# Altium footprint library 6-Connectors-3.PcbLib: 153 footprints (part 3 of 11) (continued)
## PHOENIX_1714968 [mm] "Terminal Block, 30A 300V, Pitch 6.35mm, 3 Positions, Screw Connection"
height 21.5
pads (3):
  round 2 hole 1.3: 1(-6.35,0) 2(0,0) 3(6.35,0)
Top Overlay:
  lines w0.2: -9.525,-7.5 9.525,-7.5 ; -9.525,-5.207 -9.654,-5.207 -9.832,-5.357 -10.095,-5.357 -10.095,-4.643 -9.832,-4.643 -9.654,-4.793 -9.525,-4.793 ; -9.525,-4.729 9.525,-4.729 ; -9.525,-2.7 -9.233,-2.7 ; -9.525,-2.2 -8.912,-2.2 ; -9.525,-0.2 -8.912,-0.2 ; -9.525,0.3 -9.233,0.3 ; -9.525,2.05 9.525,2.05 ; -9.525,2.354 9.525,2.354 ; -9.525,3.393 -9.654,3.393 -9.832,3.243 -10.095,3.243 -10.095,3.957 -9.832,3.957 -9.654,3.807 -9.525,3.807 ; -9.525,4.1 9.525,4.1 ; -8.348,-2.703 -6.998,-1.353 ; -7.853,-3.198 -6.14,-1.485 ; -7.405,1.067 ccw(c-6.35,-1.2) -5.295,1.067 ; -4.997,0.648 -4.847,0.798 ; -4.865,-0.21 -4.352,0.303 ; -1.998,-2.703 -0.648,-1.353 ; -1.503,-3.198 0.21,-1.485 ; -1.055,1.067 ccw(c0,-1.2) 1.055,1.067 ; 1.353,0.648 1.503,0.798 ; 1.485,-0.21 1.998,0.303 ; 4.352,-2.703 5.702,-1.353 ; 4.847,-3.198 6.56,-1.485 ; 5.295,1.067 ccw(c6.35,-1.2) 7.405,1.067 ; 7.703,0.648 7.853,0.798 ; 7.835,-0.21 8.348,0.303 ; 9.525,-2.7 9.233,-2.7 ; 9.525,-2.2 8.912,-2.2 ; 9.525,-0.2 8.912,-0.2 ; 9.525,0.3 9.233,0.3 ; -9.233,-2.7 ccw(c-6.35,-1.2) -3.467,-2.7 ; -9.233,-2.7 -8.912,-2.2 ; -9.233,0.3 cw(c-6.35,-1.2) -3.467,0.3 ; -9.233,0.3 -8.912,-0.2 ; -8.912,-2.2 ccw(c-6.35,-1.2) -3.788,-2.2 ; -8.912,-0.2 cw(c-6.35,-1.2) -3.788,-0.2 ; -3.788,-2.2 -2.562,-2.2 ; -3.788,-2.2 -3.467,-2.7 ; -3.788,-0.2 -3.467,0.3 ; -3.788,-0.2 -2.562,-0.2 ; -3.467,-2.7 -2.883,-2.7 ; -3.467,0.3 -2.883,0.3 ; -2.883,-2.7 ccw(c0,-1.2) 2.883,-2.7 ; -2.883,-2.7 -2.562,-2.2 ; -2.883,0.3 cw(c0,-1.2) 2.883,0.3 ; -2.883,0.3 -2.562,-0.2 ; -2.562,-2.2 ccw(c0,-1.2) 2.562,-2.2 ; -2.562,-0.2 cw(c0,-1.2) 2.562,-0.2 ; 2.562,-2.2 3.788,-2.2 ; 2.562,-2.2 2.883,-2.7 ; 2.562,-0.2 2.883,0.3 ; 2.562,-0.2 3.788,-0.2 ; 2.883,-2.7 3.467,-2.7 ; 2.883,0.3 3.467,0.3 ; 3.467,-2.7 ccw(c6.35,-1.2) 9.233,-2.7 ; 3.467,-2.7 3.788,-2.2 ; 3.467,0.3 cw(c6.35,-1.2) 9.233,0.3 ; 3.467,0.3 3.788,-0.2 ; 3.788,-2.2 ccw(c6.35,-1.2) 8.912,-2.2 ; 3.788,-0.2 cw(c6.35,-1.2) 8.912,-0.2 ; 8.912,-2.2 9.233,-2.7 ; 8.912,-0.2 9.233,0.3 ; -9.525,-7.9 -9.525,4.6 9.525,4.6 9.525,-7.9 -9.525,-7.9
  text "3" at 6.35,2.8 h1
  text "2" at -0.279,2.8 h1
  text "1" at -6.35,2.8 h1
Mechanical 8:
  lines w0.1: -6.85,0 -6.35,0 ; -6.35,-0.5 -6.35,0 ; -6.35,0.5 -6.35,0 ; -5.85,0 -6.35,0 ; -0.5,0 0,0 ; 0,-0.5 0,0 ; 0,0.5 0,0 ; 0.5,0 0,0 ; 5.85,0 6.35,0 ; 6.35,-0.5 6.35,0 ; 6.35,0.5 6.35,0 ; 6.85,0 6.35,0
Mechanical 14:
  circle w0.1: c-6.35,-1.2 r2.5
  circle w0.1: c0,-1.2 r2.5
  circle w0.1: c6.35,-1.2 r2.5
  lines w0.1: -9.525,-7.5 9.525,-7.5 ; -9.525,-5.207 -9.654,-5.207 -9.832,-5.357 -10.095,-5.357 -10.095,-4.643 -9.832,-4.643 -9.654,-4.793 -9.525,-4.793 ; -9.525,-4.729 9.525,-4.729 ; -9.525,-2.7 -9.233,-2.7 ; -9.525,-2.2 -8.912,-2.2 ; -9.525,-0.2 -8.912,-0.2 ; -9.525,0.3 -9.233,0.3 ; -9.525,2.05 9.525,2.05 ; -9.525,2.354 9.525,2.354 ; -9.525,3.393 -9.654,3.393 -9.832,3.243 -10.095,3.243 -10.095,3.957 -9.832,3.957 -9.654,3.807 -9.525,3.807 ; -9.525,4.1 9.525,4.1 ; -8.348,-2.703 -4.847,0.798 ; -7.853,-3.198 -4.352,0.303 ; -1.998,-2.703 1.503,0.798 ; -1.503,-3.198 1.998,0.303 ; 4.352,-2.703 7.853,0.798 ; 4.847,-3.198 8.348,0.303 ; 9.525,-2.7 9.233,-2.7 ; 9.525,-2.2 8.912,-2.2 ; 9.525,-0.2 8.912,-0.2 ; 9.525,0.3 9.233,0.3 ; -9.233,-2.7 ccw(c-6.35,-1.2) -3.467,-2.7 ; -9.233,-2.7 -8.912,-2.2 ; -9.233,0.3 cw(c-6.35,-1.2) -3.467,0.3 ; -9.233,0.3 -8.912,-0.2 ; -8.912,-2.2 ccw(c-6.35,-1.2) -3.788,-2.2 ; -8.912,-0.2 cw(c-6.35,-1.2) -3.788,-0.2 ; -3.788,-2.2 -2.562,-2.2 ; -3.788,-2.2 -3.467,-2.7 ; -3.788,-0.2 -3.467,0.3 ; -3.788,-0.2 -2.562,-0.2 ; -3.467,-2.7 -2.883,-2.7 ; -3.467,0.3 -2.883,0.3 ; -2.883,-2.7 ccw(c0,-1.2) 2.883,-2.7 ; -2.883,-2.7 -2.562,-2.2 ; -2.883,0.3 cw(c0,-1.2) 2.883,0.3 ; -2.883,0.3 -2.562,-0.2 ; -2.562,-2.2 ccw(c0,-1.2) 2.562,-2.2 ; -2.562,-0.2 cw(c0,-1.2) 2.562,-0.2 ; 2.562,-2.2 3.788,-2.2 ; 2.562,-2.2 2.883,-2.7 ; 2.562,-0.2 2.883,0.3 ; 2.562,-0.2 3.788,-0.2 ; 2.883,-2.7 3.467,-2.7 ; 2.883,0.3 3.467,0.3 ; 3.467,-2.7 ccw(c6.35,-1.2) 9.233,-2.7 ; 3.467,-2.7 3.788,-2.2 ; 3.467,0.3 cw(c6.35,-1.2) 9.233,0.3 ; 3.467,0.3 3.788,-0.2 ; 3.788,-2.2 ccw(c6.35,-1.2) 8.912,-2.2 ; 3.788,-0.2 cw(c6.35,-1.2) 8.912,-0.2 ; 8.912,-2.2 9.233,-2.7 ; 8.912,-0.2 9.233,0.3 ; -9.525,-7.9 -9.525,4.6 9.525,4.6 9.525,-7.9 -9.525,-7.9
  text "1" at -6.35,2.8 h1
  text "2" at -0.279,2.8 h1
  text "3" at 6.35,2.8 h1
3D body "PHOENIX_1714968.stp": height 21.5, standoff -5, extent -10.095,-7.9 9.525,4.6

## PHOENIX_1715721 [mm] "Terminal Block, 17.5A 400V, Pitch 5.08mm, 2 Positions, Screw Connection"
height 13.8
pads (2):
  round 2 hole 1.3: 1(-2.54,0) 2(2.54,0)
Top Overlay:
  circle w0.2: c2.54,-0.2 r2
  circle w0.2: c-2.54,-0.2 r2
  circle w0.2: c0,1.1 r0.5
  lines w0.2: -5.08,-4.1 5.08,-4.1 ; -5.08,-3.869 -5.247,-3.869 -5.479,-4.064 -5.821,-4.064 -5.821,-3.136 -5.479,-3.136 -5.247,-3.331 -5.08,-3.331 ; -5.08,-2.672 5.08,-2.672 ; -5.08,-2.283 5.08,-2.283 ; -5.08,1.909 5.08,1.909 ; -5.08,2.29 5.08,2.29 ; -5.08,-4.6 -5.08,5.2 5.08,5.2 5.08,-4.6 -5.08,-4.6
  text "1" at -2.699,2.857 h1
  text "2" at 2.222,2.857 h1
Mechanical 8:
  lines w0.1: -3.04,0 -2.54,0 ; -2.54,-0.5 -2.54,0 ; -2.54,0.5 -2.54,0 ; -2.04,0 -2.54,0 ; -0.5,0 0,0 ; 0,-0.5 0,0 ; 0,0.5 0,0 ; 0.5,0 0,0 ; 2.04,0 2.54,0 ; 2.54,-0.5 2.54,0 ; 2.54,0.5 2.54,0 ; 3.04,0 2.54,0
Mechanical 14:
  circle w0.1: c-2.54,-0.2 r1.891
  circle w0.1: c2.54,-0.2 r1.891
  circle w0.1: c0,1.1 r0.5
  circle w0.1: c-2.54,-0.2 r2
  circle w0.1: c2.54,-0.2 r2
  lines w0.1: -5.08,-4.1 5.08,-4.1 ; -5.08,-3.869 -5.247,-3.869 -5.479,-4.064 -5.821,-4.064 -5.821,-3.136 -5.479,-3.136 -5.247,-3.331 -5.08,-3.331 ; -5.08,-2.672 5.08,-2.672 ; -5.08,-2.283 5.08,-2.283 ; -5.08,1.909 5.08,1.909 ; -5.08,2.29 5.08,2.29 ; -4.043,-1.349 -1.391,1.303 ; -3.689,-1.703 -1.037,0.949 ; 1.037,-1.349 3.689,1.303 ; 1.391,-1.703 4.043,0.949 ; -5.08,-4.6 5.08,-4.6 5.08,5.2 -5.08,5.2 -5.08,-4.6
  text "1" at -2.699,2.857 h1
  text "2" at 2.222,2.857 h1
3D body "PHOENIX_1715721.stp": height 14.19, standoff -3.5, extent -5.821,-4.6 5.08,5.2

## PHOENIX_1715734 [mm] "Terminal Block, 17.5A 400V, Pitch 5.08mm, 3 Positions, Screw Connection"
height 13.8
pads (3):
  round 2 hole 1.3: 1(-5.08,0) 2(0,0) 3(5.08,0)
Top Overlay:
  circle w0.2: c-2.54,1.1 r0.5
  circle w0.2: c2.54,1.1 r0.5
  circle w0.2: c-5.08,-0.2 r2
  circle w0.2: c0,-0.2 r2
  circle w0.2: c5.08,-0.2 r2
  lines w0.2: -7.62,-4.1 7.62,-4.1 ; -7.62,-3.869 -7.787,-3.869 -8.019,-4.064 -8.361,-4.064 -8.361,-3.136 -8.019,-3.136 -7.787,-3.331 -7.62,-3.331 ; -7.62,-2.672 7.62,-2.672 ; -7.62,-2.283 7.62,-2.283 ; -7.62,1.909 7.62,1.909 ; -7.62,2.29 7.62,2.29 ; -7.62,-4.6 7.62,-4.6 7.62,5.2 -7.62,5.2 -7.62,-4.6
  text "1" at -5.239,2.857 h1
  text "2" at -0.318,2.857 h1
  text "3" at 4.763,2.857 h1
Mechanical 8:
  lines w0.1: -5.58,0 -5.08,0 ; -5.08,-0.5 -5.08,0 ; -5.08,0.5 -5.08,0 ; -4.58,0 -5.08,0 ; -0.5,0 0,0 ; 0,-0.5 0,0 ; 0,0.5 0,0 ; 0.5,0 0,0 ; 4.58,0 5.08,0 ; 5.08,-0.5 5.08,0 ; 5.08,0.5 5.08,0 ; 5.58,0 5.08,0
Mechanical 14:
  circle w0.1: c5.08,-0.2 r2
  circle w0.1: c0,-0.2 r2
  circle w0.1: c-5.08,-0.2 r2
  circle w0.1: c2.54,1.1 r0.5
  circle w0.1: c-2.54,1.1 r0.5
  circle w0.1: c5.08,-0.2 r1.891
  circle w0.1: c0,-0.2 r1.891
  circle w0.1: c-5.08,-0.2 r1.891
  lines w0.1: -7.62,-4.1 7.62,-4.1 ; -7.62,-3.869 -7.787,-3.869 -8.019,-4.064 -8.361,-4.064 -8.361,-3.136 -8.019,-3.136 -7.787,-3.331 -7.62,-3.331 ; -7.62,-2.672 7.62,-2.672 ; -7.62,-2.283 7.62,-2.283 ; -7.62,1.909 7.62,1.909 ; -7.62,2.29 7.62,2.29 ; -6.583,-1.349 -3.931,1.303 ; -6.229,-1.703 -3.577,0.949 ; -1.503,-1.349 1.149,1.303 ; -1.149,-1.703 1.503,0.949 ; 3.577,-1.349 6.229,1.303 ; 3.931,-1.703 6.583,0.949 ; -7.62,-4.6 -7.62,5.2 7.62,5.2 7.62,-4.6 -7.62,-4.6
  text "1" at -5.239,2.857 h1
  text "2" at -0.318,2.857 h1
  text "3" at 4.763,2.857 h1
3D body "PHOENIX_1715734.stp": height 14.19, standoff -3.5, extent -8.361,-4.6 7.62,5.2

## PHOENIX_1715747 [mm] "Terminal Block, 17.5A 400V, Pitch 5.08mm, 4 Positions, Screw Connection"
height 13.8
pads (4):
  round 2 hole 1.3: 1(-7.62,0) 2(-2.54,0) 3(2.54,0) 4(7.62,0)
Top Overlay:
  circle w0.2: c-7.62,-0.2 r2
  circle w0.2: c-2.54,-0.2 r2
  circle w0.2: c2.54,-0.2 r2
  circle w0.2: c7.62,-0.2 r2
  circle w0.2: c-5.08,1.1 r0.49
  circle w0.2: c0,1.1 r0.49
  circle w0.2: c5.08,1.1 r0.49
  lines w0.2: -10.16,-4.1 10.16,-4.1 ; -10.16,-3.869 -10.327,-3.869 -10.559,-4.064 -10.901,-4.064 -10.901,-3.136 -10.559,-3.136 -10.327,-3.331 -10.16,-3.331 ; -10.16,-2.672 10.16,-2.672 ; -10.16,-2.283 10.16,-2.283 ; -10.16,1.909 10.16,1.909 ; -10.16,2.29 10.16,2.29 ; -10.16,-4.6 -10.16,5.2 10.16,5.2 10.16,-4.6 -10.16,-4.6
  text "4" at 7.302,2.857 h1
  text "3" at 2.222,2.857 h1
  text "2" at -2.857,2.857 h1
  text "1" at -7.779,2.857 h1
Mechanical 8:
  lines w0.1: -8.12,0 -7.62,0 ; -7.62,-0.5 -7.62,0 ; -7.62,0.5 -7.62,0 ; -7.12,0 -7.62,0 ; -3.04,0 -2.54,0 ; -2.54,-0.5 -2.54,0 ; -2.54,0.5 -2.54,0 ; -2.04,0 -2.54,0 ; 2.04,0 2.54,0 ; 2.54,-0.5 2.54,0 ; 2.54,0.5 2.54,0 ; 3.04,0 2.54,0 ; 7.12,0 7.62,0 ; 7.62,-0.5 7.62,0 ; 7.62,0.5 7.62,0 ; 8.12,0 7.62,0 ; 10.16,-3.869 9.993,-3.869 9.761,-4.064 9.419,-4.064 9.419,-3.136 9.761,-3.136 9.993,-3.331 10.16,-3.331
Mechanical 14:
  circle w0.1: c5.08,1.1 r0.49
  circle w0.1: c0,1.1 r0.49
  circle w0.1: c-5.08,1.1 r0.49
  circle w0.1: c7.62,-0.2 r2
  circle w0.1: c7.62,-0.2 r1.891
  circle w0.1: c2.54,-0.2 r2
  circle w0.1: c2.54,-0.2 r1.891
  circle w0.1: c-2.54,-0.2 r2
  circle w0.1: c-2.54,-0.2 r1.891
  circle w0.1: c-7.62,-0.2 r2
  circle w0.1: c-7.62,-0.2 r1.891
  lines w0.1: -10.16,-4.1 10.16,-4.1 ; -10.16,-3.869 -10.327,-3.869 -10.559,-4.064 -10.901,-4.064 -10.901,-3.136 -10.559,-3.136 -10.327,-3.331 -10.16,-3.331 ; -10.16,-2.672 10.16,-2.672 ; -10.16,-2.283 10.16,-2.283 ; -10.16,1.909 10.16,1.909 ; -10.16,2.29 10.16,2.29 ; -9.182,-1.267 -6.553,1.362 ; -8.687,-1.762 -6.058,0.867 ; -4.102,-1.267 -1.473,1.362 ; -3.607,-1.762 -0.978,0.867 ; 0.978,-1.267 3.607,1.362 ; 1.473,-1.762 4.102,0.867 ; 6.058,-1.267 8.687,1.362 ; 6.553,-1.762 9.182,0.867 ; -10.16,-4.6 10.16,-4.6 10.16,5.2 -10.16,5.2 -10.16,-4.6
  text "4" at 7.302,2.857 h1
  text "3" at 2.222,2.857 h1
  text "2" at -2.857,2.857 h1
  text "1" at -7.779,2.857 h1
3D body "PHOENIX_1715747.stp": height 14.2, standoff -3.5, extent -10.901,-4.6 10.16,5.2

## PHOENIX_1715789 [mm] "Terminal Block, 17.5A 400V, Pitch 5.08mm, 8 Positions, Screw Connection"
height 13.8
pads (8):
  round 2 hole 1.3: 1(-17.78,0) 2(-12.7,0) 3(-7.62,0) 4(-2.54,0) 5(2.54,0) 6(7.62,0) 7(12.7,0) 8(17.78,0)
Top Overlay:
  circle w0.2: c-17.78,-0.2 r2
  circle w0.2: c-12.7,-0.2 r2
  circle w0.2: c-7.62,-0.2 r2
  circle w0.2: c-2.54,-0.2 r2
  circle w0.2: c-15.24,1.1 r0.49
  circle w0.2: c-10.16,1.1 r0.49
  circle w0.2: c-5.08,1.1 r0.49
  circle w0.2: c2.54,-0.2 r2
  circle w0.2: c0,1.1 r0.49
  circle w0.2: c7.62,-0.2 r2
  circle w0.2: c5.08,1.1 r0.49
  circle w0.2: c12.7,-0.2 r2
  circle w0.2: c10.16,1.1 r0.49
  circle w0.2: c17.78,-0.2 r2
  circle w0.2: c15.24,1.1 r0.49
  lines w0.2: -20.32,-4.1 20.32,-4.1 ; -20.32,-3.869 -20.487,-3.869 -20.719,-4.064 -21.061,-4.064 -21.061,-3.136 -20.719,-3.136 -20.487,-3.331 -20.32,-3.331 ; -20.32,-2.672 20.32,-2.672 ; -20.32,-2.283 20.32,-2.283 ; -20.32,1.909 20.32,1.909 ; -20.32,2.29 20.32,2.29 ; -20.32,-4.6 -20.32,5.2 20.32,5.2 20.32,-4.6 -20.32,-4.6
  text "8" at 17.462,2.857 h1
  text "7" at 12.383,2.857 h1
  text "6" at 7.302,2.857 h1
  text "5" at 2.222,2.857 h1
  text "4" at -2.857,2.857 h1
  text "3" at -7.938,2.857 h1
  text "2" at -13.018,2.857 h1
  text "1" at -17.939,2.857 h1
Mechanical 8:
  lines w0.1: -18.28,0 -17.78,0 ; -17.78,-0.5 -17.78,0 ; -17.78,0.5 -17.78,0 ; -17.28,0 -17.78,0 ; -13.2,0 -12.7,0 ; -12.7,-0.5 -12.7,0 ; -12.7,0.5 -12.7,0 ; -12.2,0 -12.7,0 ; -8.12,0 -7.62,0 ; -7.62,-0.5 -7.62,0 ; -7.62,0.5 -7.62,0 ; -7.12,0 -7.62,0 ; -3.04,0 -2.54,0 ; -2.54,-0.5 -2.54,0 ; -2.54,0.5 -2.54,0 ; -2.04,0 -2.54,0 ; 2.04,0 2.54,0 ; 2.54,-0.5 2.54,0 ; 2.54,0.5 2.54,0 ; 3.04,0 2.54,0 ; 7.12,0 7.62,0 ; 7.62,-0.5 7.62,0 ; 7.62,0.5 7.62,0 ; 8.12,0 7.62,0 ; 12.2,0 12.7,0 ; 12.7,-0.5 12.7,0 ; 12.7,0.5 12.7,0 ; 13.2,0 12.7,0 ; 17.28,0 17.78,0 ; 17.78,-0.5 17.78,0 ; 17.78,0.5 17.78,0 ; 18.28,0 17.78,0 ; 20.32,-3.869 20.153,-3.869 19.921,-4.064 19.579,-4.064 19.579,-3.136 19.921,-3.136 20.153,-3.331 20.32,-3.331
Mechanical 14:
  circle w0.1: c15.24,1.1 r0.49
  circle w0.1: c17.78,-0.2 r2
  circle w0.1: c17.78,-0.2 r1.891
  circle w0.1: c10.16,1.1 r0.49
  circle w0.1: c12.7,-0.2 r2
  circle w0.1: c12.7,-0.2 r1.891
  circle w0.1: c5.08,1.1 r0.49
  circle w0.1: c7.62,-0.2 r2
  circle w0.1: c7.62,-0.2 r1.891
  circle w0.1: c0,1.1 r0.49
  circle w0.1: c2.54,-0.2 r2
  circle w0.1: c2.54,-0.2 r1.891
  circle w0.1: c-5.08,1.1 r0.49
  circle w0.1: c-10.16,1.1 r0.49
  circle w0.1: c-15.24,1.1 r0.49
  circle w0.1: c-2.54,-0.2 r2
  circle w0.1: c-2.54,-0.2 r1.891
  circle w0.1: c-7.62,-0.2 r2
  circle w0.1: c-7.62,-0.2 r1.891
  circle w0.1: c-12.7,-0.2 r2
  circle w0.1: c-12.7,-0.2 r1.891
  circle w0.1: c-17.78,-0.2 r2
  circle w0.1: c-17.78,-0.2 r1.891
  lines w0.1: -20.32,-4.1 20.32,-4.1 ; -20.32,-3.869 -20.487,-3.869 -20.719,-4.064 -21.061,-4.064 -21.061,-3.136 -20.719,-3.136 -20.487,-3.331 -20.32,-3.331 ; -20.32,-2.672 20.32,-2.672 ; -20.32,-2.283 20.32,-2.283 ; -20.32,1.909 20.32,1.909 ; -20.32,2.29 20.32,2.29 ; -19.342,-1.267 -16.713,1.362 ; -18.847,-1.762 -16.218,0.867 ; -14.262,-1.267 -11.633,1.362 ; -13.767,-1.762 -11.138,0.867 ; -9.182,-1.267 -6.553,1.362 ; -8.687,-1.762 -6.058,0.867 ; -4.102,-1.267 -1.473,1.362 ; -3.607,-1.762 -0.978,0.867 ; 0.978,-1.267 3.607,1.362 ; 1.473,-1.762 4.102,0.867 ; 6.058,-1.267 8.687,1.362 ; 6.553,-1.762 9.182,0.867 ; 11.138,-1.267 13.767,1.362 ; 11.633,-1.762 14.262,0.867 ; 16.218,-1.267 18.847,1.362 ; 16.713,-1.762 19.342,0.867 ; -20.32,-4.6 20.32,-4.6 20.32,5.2 -20.32,5.2 -20.32,-4.6
  text "8" at 17.462,2.857 h1
  text "7" at 12.383,2.857 h1
  text "6" at 7.302,2.857 h1
  text "5" at 2.222,2.857 h1
  text "4" at -2.857,2.857 h1
  text "3" at -7.938,2.857 h1
  text "2" at -13.018,2.857 h1
  text "1" at -17.939,2.857 h1
3D body "PHOENIX_1715789.stp": height 14.2, standoff -3.5, extent -21.061,-4.6 20.32,5.2

## PHOENIX_1715828 [mm] "Terminal Block, 17.5A 400V, Pitch 5.08mm, 12 Positions, Screw Connection"
height 13.8
pads (12):
  round 2 hole 1.3: 1(-27.94,0) 2(-22.86,0) 3(-17.78,0) 4(-12.7,0) 5(-7.62,0) 6(-2.54,0) 7(2.54,0) 8(7.62,0) 9(12.7,0) 10(17.78,0) 11(22.86,0) 12(27.94,0)
Top Overlay:
  circle w0.2: c25.4,1.1 r0.49
  circle w0.2: c27.94,-0.2 r2
  circle w0.2: c20.32,1.1 r0.49
  circle w0.2: c22.86,-0.2 r2
  circle w0.2: c15.24,1.1 r0.49
  circle w0.2: c17.78,-0.2 r2
  circle w0.2: c10.16,1.1 r0.49
  circle w0.2: c12.7,-0.2 r2
  circle w0.2: c5.08,1.1 r0.49
  circle w0.2: c7.62,-0.2 r2
  circle w0.2: c0,1.1 r0.49
  circle w0.2: c2.54,-0.2 r2
  circle w0.2: c-5.08,1.1 r0.49
  circle w0.2: c-2.54,-0.2 r2
  circle w0.2: c-10.16,1.1 r0.49
  circle w0.2: c-7.62,-0.2 r2
  circle w0.2: c-15.24,1.1 r0.49
  circle w0.2: c-20.32,1.1 r0.49
  circle w0.2: c-25.4,1.1 r0.49
  circle w0.2: c-12.7,-0.2 r2
  circle w0.2: c-17.78,-0.2 r2
  circle w0.2: c-22.86,-0.2 r2
  circle w0.2: c-27.94,-0.2 r2
  lines w0.2: -30.48,-4.1 30.48,-4.1 ; -30.48,-3.869 -30.647,-3.869 -30.879,-4.064 -31.221,-4.064 -31.221,-3.136 -30.879,-3.136 -30.647,-3.331 -30.48,-3.331 ; -30.48,-2.672 30.48,-2.672 ; -30.48,-2.283 30.48,-2.283 ; -30.48,1.909 30.48,1.909 ; -30.48,2.29 30.48,2.29 ; -30.48,-4.6 30.48,-4.6 30.48,5.2 -30.48,5.2 -30.48,-4.6
  text "8" at 7.303,2.857 h1
  text "7" at 2.223,2.857 h1
  text "6" at -2.857,2.857 h1
  text "5" at -7.937,2.857 h1
  text "4" at -13.017,2.857 h1
  text "3" at -18.097,2.857 h1
  text "2" at -23.177,2.857 h1
  text "1" at -28.099,2.857 h1
  text "9" at 12.383,2.857 h1
  text "10" at 17.145,2.857 h1
  text "11" at 22.225,2.857 h1
  text "12" at 27.146,2.857 h1
Mechanical 8:
  lines w0.1: -28.44,0 -27.94,0 ; -27.94,-0.5 -27.94,0 ; -27.94,0.5 -27.94,0 ; -27.44,0 -27.94,0 ; -23.36,0 -22.86,0 ; -22.86,-0.5 -22.86,0 ; -22.86,0.5 -22.86,0 ; -22.36,0 -22.86,0 ; -18.28,0 -17.78,0 ; -17.78,-0.5 -17.78,0 ; -17.78,0.5 -17.78,0 ; -17.28,0 -17.78,0 ; -13.2,0 -12.7,0 ; -12.7,-0.5 -12.7,0 ; -12.7,0.5 -12.7,0 ; -12.2,0 -12.7,0 ; -8.12,0 -7.62,0 ; -7.62,-0.5 -7.62,0 ; -7.62,0.5 -7.62,0 ; -7.12,0 -7.62,0 ; -3.04,0 -2.54,0 ; -2.54,-0.5 -2.54,0 ; -2.54,0.5 -2.54,0 ; -2.04,0 -2.54,0 ; 2.04,0 2.54,0 ; 2.54,-0.5 2.54,0 ; 2.54,0.5 2.54,0 ; 3.04,0 2.54,0 ; 7.12,0 7.62,0 ; 7.62,-0.5 7.62,0 ; 7.62,0.5 7.62,0 ; 8.12,0 7.62,0 ; 12.2,0 12.7,0 ; 12.7,-0.5 12.7,0 ; 12.7,0.5 12.7,0 ; 13.2,0 12.7,0 ; 17.28,0 17.78,0 ; 17.78,-0.5 17.78,0 ; 17.78,0.5 17.78,0 ; 18.28,0 17.78,0 ; 22.36,0 22.86,0 ; 22.86,-0.5 22.86,0 ; 22.86,0.5 22.86,0 ; 23.36,0 22.86,0 ; 27.44,0 27.94,0 ; 27.94,-0.5 27.94,0 ; 27.94,0.5 27.94,0 ; 28.44,0 27.94,0 ; 30.48,-3.869 30.313,-3.869 30.081,-4.064 29.739,-4.064 29.739,-3.136 30.081,-3.136 30.313,-3.331 30.48,-3.331
Mechanical 14:
  circle w0.1: c-27.94,-0.2 r1.891
  circle w0.1: c-27.94,-0.2 r2
  circle w0.1: c-22.86,-0.2 r1.891
  circle w0.1: c-22.86,-0.2 r2
  circle w0.1: c-17.78,-0.2 r1.891
  circle w0.1: c-17.78,-0.2 r2
  circle w0.1: c-12.7,-0.2 r1.891
  circle w0.1: c-12.7,-0.2 r2
  circle w0.1: c-25.4,1.1 r0.49
  circle w0.1: c-20.32,1.1 r0.49
  circle w0.1: c-15.24,1.1 r0.49
  circle w0.1: c-7.62,-0.2 r1.891
  circle w0.1: c-7.62,-0.2 r2
  circle w0.1: c-10.16,1.1 r0.49
  circle w0.1: c-2.54,-0.2 r1.891
  circle w0.1: c-2.54,-0.2 r2
  circle w0.1: c-5.08,1.1 r0.49
  circle w0.1: c2.54,-0.2 r1.891
  circle w0.1: c2.54,-0.2 r2
  circle w0.1: c0,1.1 r0.49
  circle w0.1: c7.62,-0.2 r1.891
  circle w0.1: c7.62,-0.2 r2
  circle w0.1: c5.08,1.1 r0.49
  circle w0.1: c12.7,-0.2 r1.891
  circle w0.1: c12.7,-0.2 r2
  circle w0.1: c10.16,1.1 r0.49
  circle w0.1: c17.78,-0.2 r1.891
  circle w0.1: c17.78,-0.2 r2
  circle w0.1: c15.24,1.1 r0.49
  circle w0.1: c22.86,-0.2 r1.891
  circle w0.1: c22.86,-0.2 r2
  circle w0.1: c20.32,1.1 r0.49
  circle w0.1: c27.94,-0.2 r1.891
  circle w0.1: c27.94,-0.2 r2
  circle w0.1: c25.4,1.1 r0.49
  lines w0.1: -30.48,-4.1 30.48,-4.1 ; -30.48,-3.869 -30.647,-3.869 -30.879,-4.064 -31.221,-4.064 -31.221,-3.136 -30.879,-3.136 -30.647,-3.331 -30.48,-3.331 ; -30.48,-2.672 30.48,-2.672 ; -30.48,-2.283 30.48,-2.283 ; -30.48,1.909 30.48,1.909 ; -30.48,2.29 30.48,2.29 ; -29.502,-1.267 -26.873,1.362 ; -29.007,-1.762 -26.378,0.867 ; -24.422,-1.267 -21.793,1.362 ; -23.927,-1.762 -21.298,0.867 ; -19.342,-1.267 -16.713,1.362 ; -18.847,-1.762 -16.218,0.867 ; -14.262,-1.267 -11.633,1.362 ; -13.767,-1.762 -11.138,0.867 ; -9.182,-1.267 -6.553,1.362 ; -8.687,-1.762 -6.058,0.867 ; -4.102,-1.267 -1.473,1.362 ; -3.607,-1.762 -0.978,0.867 ; 0.978,-1.267 3.607,1.362 ; 1.473,-1.762 4.102,0.867 ; 6.058,-1.267 8.687,1.362 ; 6.553,-1.762 9.182,0.867 ; 11.138,-1.267 13.767,1.362 ; 11.633,-1.762 14.262,0.867 ; 16.218,-1.267 18.847,1.362 ; 16.713,-1.762 19.342,0.867 ; 21.298,-1.267 23.927,1.362 ; 21.793,-1.762 24.422,0.867 ; 26.378,-1.267 29.007,1.362 ; 26.873,-1.762 29.502,0.867 ; -30.48,-4.6 -30.48,5.2 30.48,5.2 30.48,-4.6 -30.48,-4.6
  text "8" at 7.303,2.857 h1
  text "7" at 2.223,2.857 h1
  text "6" at -2.857,2.857 h1
  text "5" at -7.937,2.857 h1
  text "4" at -13.017,2.857 h1
  text "3" at -18.097,2.857 h1
  text "2" at -23.177,2.857 h1
  text "1" at -28.099,2.857 h1
  text "9" at 12.383,2.857 h1
  text "10" at 17.145,2.857 h1
  text "11" at 22.225,2.857 h1
  text "12" at 27.146,2.857 h1
3D body "PHOENIX_1715828.stp": height 14.2, standoff -3.5, extent -31.221,-4.6 30.48,5.2

## PHOENIX_1720929 [mm] "PCB Header, 41A, 630V, Pitch: 7.62mm, 4 Positions, PCV Serie"
height 29.25
pads (14):
  round 2 hole 1.3: 1(-11.43,-4.25) 1(-11.43,-1.71) 1(-11.43,3.37) 2(-3.81,-4.25) 2(-3.81,-1.71) 2(-3.81,3.37) 3(3.81,-4.25) 3(3.81,-1.71) 3(3.81,3.37) 4(11.43,-4.25) 4(11.43,-1.71) 4(11.43,3.37)
  round 1 hole 3.2 unplated mask+1.2: P1(-19.49,-0.37) P2(19.49,-0.37)
Top Overlay:
  lines w0.2: -18.2,-2.37 -16.29,-2.37 -16.29,-3.897 -15.69,-3.897 -15.69,3.157 -16.29,3.157 -16.29,1.63 -18.2,1.63 ; -16.79,-2.37 -16.79,1.63 ; -15.24,6.77 -15.24,7.52 15.24,7.52 15.24,6.77 ; -12.949,4.945 -12.949,5.139 ccw(c-13.142,5.139) -12.994,5.263 -13.234,5.548 cw(c-13.087,5.673) -13.28,5.673 cw(c-13.087,5.673) -13.087,5.866 -9.774,5.866 cw(c-9.774,5.673) -9.626,5.548 -9.866,5.263 ccw(c-9.718,5.139) -9.912,5.139 -9.912,4.945 ; -12.88,5.866 -12.88,4.945 -14.28,4.945 -14.28,-4.22 -12.833,-4.22 ; -12.468,-0.77 -12.93,-0.77 -12.93,0.03 -9.93,0.03 -9.93,-0.77 -10.393,-0.77 ; -12.23,0.03 -12.23,1.016 cw(c-11.43,-0.37) -10.103,-1.264 ; -10.033,-4.22 -8.055,-4.22 -8.055,4.945 -9.98,4.945 -9.98,5.866 ; -5.329,4.945 -5.329,5.139 ccw(c-5.522,5.139) -5.374,5.263 -5.614,5.548 cw(c-5.467,5.673) -5.467,5.866 -2.154,5.866 cw(c-2.154,5.673) -2.006,5.548 -2.246,5.263 ccw(c-2.098,5.139) -2.292,5.139 -2.292,4.945 ; -5.26,5.866 -5.26,4.945 -7.185,4.945 -7.185,-4.22 -5.213,-4.22 ; -5.137,-1.264 cw(c-3.81,-0.37) -2.483,-1.264 ; -4.847,-0.77 -5.31,-0.77 -5.31,0.03 -2.31,0.03 -2.31,-0.77 -2.773,-0.77 ; -2.413,-4.22 -0.435,-4.22 -0.435,4.945 -2.36,4.945 -2.36,5.866 ; 2.294,4.945 2.294,5.139 ccw(c2.101,5.139) 2.248,5.263 2.008,5.548 cw(c2.156,5.673) 2.156,5.866 5.469,5.866 cw(c5.469,5.673) 5.617,5.548 5.377,5.263 ccw(c5.525,5.139) 5.331,5.139 5.331,4.945 ; 2.363,5.866 2.363,4.945 0.438,4.945 0.438,-4.22 2.41,-4.22 ; 2.483,-1.264 cw(c3.81,-0.37) 5.137,-1.264 ; 2.773,-0.77 2.31,-0.77 2.31,0.03 5.31,0.03 5.31,-0.77 4.847,-0.77 ; 5.21,-4.22 7.188,-4.22 7.188,4.945 5.263,4.945 5.263,5.866 ; 9.914,4.945 9.914,5.139 ccw(c9.721,5.139) 9.868,5.263 9.628,5.548 cw(c9.776,5.673) 9.776,5.866 13.089,5.866 cw(c13.089,5.673) 13.237,5.548 12.997,5.263 ccw(c13.145,5.139) 12.951,5.139 12.951,4.945 ; 9.983,5.866 9.983,4.945 8.058,4.945 8.058,-4.22 10.03,-4.22 ; 10.103,-1.264 cw(c11.43,-0.37) 12.757,-1.264 ; 10.393,-0.77 9.93,-0.77 9.93,0.03 12.93,0.03 12.93,-0.77 12.468,-0.77 ; 12.83,-4.22 14.28,-4.22 14.28,4.945 12.883,4.945 12.883,5.866 ; 16.79,-2.37 16.79,1.63 ; 18.2,-2.37 16.29,-2.37 16.29,-3.897 15.69,-3.897 15.69,3.157 16.29,3.157 16.29,1.63 18.2,1.63 ; -23.29,-6.27 ccw(c-22.79,-6.27) -22.79,-6.77 22.79,-6.77 ccw(c22.79,-6.27) 23.29,-6.27 23.29,5.53 ccw(c22.79,5.53) 22.79,6.03 15.69,6.03 15.69,6.77 -15.69,6.77 -15.69,6.03 -22.79,6.03 ccw(c-22.79,5.53) -23.29,5.53 -23.29,-6.27 ; -7.821,0.295 -7.62,-0.455 -7.419,0.295 -7.821,0.295 ; -7.821,6.975 -7.419,6.975 -7.62,6.77 -7.821,6.975 ; -0.201,0.295 0,-0.455 0.201,0.295 -0.201,0.295 ; -0.201,6.975 0.201,6.975 0,6.77 -0.201,6.975 ; 7.419,0.295 7.821,0.295 7.62,-0.455 7.419,0.295 ; 7.419,6.975 7.62,6.77 7.821,6.975 7.419,6.975
  text "1" at -16.795,6.6 h1
  text "4" at 9.315,2.975 h1
  text "3" at 1.695,2.975 h1
  text "2" at -5.925,2.975 h1
  text "1" at -13.545,2.975 h1
Mechanical 8:
  lines w0.1: -19.99,-0.37 -19.49,-0.37 ; -19.49,-0.87 -19.49,-0.37 ; -19.49,0.13 -19.49,-0.37 ; -18.99,-0.37 -19.49,-0.37 ; -11.93,-4.25 -11.43,-4.25 ; -11.93,-1.71 -11.43,-1.71 ; -11.93,3.37 -11.43,3.37 ; -11.43,-4.75 -11.43,-4.25 ; -11.43,-3.75 -11.43,-4.25 ; -11.43,-2.21 -11.43,-1.71 ; -11.43,-1.21 -11.43,-1.71 ; -11.43,2.87 -11.43,3.37 ; -11.43,3.87 -11.43,3.37 ; -10.93,-4.25 -11.43,-4.25 ; -10.93,-1.71 -11.43,-1.71 ; -10.93,3.37 -11.43,3.37 ; -4.31,-4.25 -3.81,-4.25 ; -4.31,-1.71 -3.81,-1.71 ; -4.31,3.37 -3.81,3.37 ; -3.81,-4.75 -3.81,-4.25 ; -3.81,-3.75 -3.81,-4.25 ; -3.81,-2.21 -3.81,-1.71 ; -3.81,-1.21 -3.81,-1.71 ; -3.81,2.87 -3.81,3.37 ; -3.81,3.87 -3.81,3.37 ; -3.31,-4.25 -3.81,-4.25 ; -3.31,-1.71 -3.81,-1.71 ; -3.31,3.37 -3.81,3.37 ; -0.5,0 0,0 ; 0,-0.5 0,0 ; 0,0.5 0,0 ; 0.5,0 0,0 ; 3.31,-4.25 3.81,-4.25 ; 3.31,-1.71 3.81,-1.71 ; 3.31,3.37 3.81,3.37 ; 3.81,-4.75 3.81,-4.25 ; 3.81,-3.75 3.81,-4.25 ; 3.81,-2.21 3.81,-1.71 ; 3.81,-1.21 3.81,-1.71 ; 3.81,2.87 3.81,3.37 ; 3.81,3.87 3.81,3.37 ; 4.31,-4.25 3.81,-4.25 ; 4.31,-1.71 3.81,-1.71 ; 4.31,3.37 3.81,3.37 ; 10.93,-4.25 11.43,-4.25 ; 10.93,-1.71 11.43,-1.71 ; 10.93,3.37 11.43,3.37 ; 11.43,-4.75 11.43,-4.25 ; 11.43,-3.75 11.43,-4.25 ; 11.43,-2.21 11.43,-1.71 ; 11.43,-1.21 11.43,-1.71 ; 11.43,2.87 11.43,3.37 ; 11.43,3.87 11.43,3.37 ; 11.93,-4.25 11.43,-4.25 ; 11.93,-1.71 11.43,-1.71 ; 11.93,3.37 11.43,3.37 ; 18.99,-0.37 19.49,-0.37 ; 19.49,-0.87 19.49,-0.37 ; 19.49,0.13 19.49,-0.37 ; 19.99,-0.37 19.49,-0.37
Mechanical 14:
  circle w0.1: c11.43,-0.37 r1.6
  circle w0.1: c3.81,-0.37 r1.6
  circle w0.1: c-3.81,-0.37 r1.6
  circle w0.1: c19.49,-0.37 r1.2
  circle w0.1: c-19.49,-0.37 r1.2
  lines w0.1: -16.79,-2.37 -16.79,1.63 ; -15.24,6.77 -15.24,7.52 15.24,7.52 15.24,6.77 ; -12.949,4.945 -12.949,5.139 ccw(c-13.142,5.139) -12.994,5.263 -13.234,5.548 cw(c-13.087,5.673) -13.28,5.673 cw(c-13.087,5.673) -13.087,5.866 -9.774,5.866 cw(c-9.774,5.673) -9.626,5.548 -9.866,5.263 ccw(c-9.718,5.139) -9.912,5.139 -9.912,4.945 ; -12.88,5.866 -12.88,4.945 -14.28,4.945 -14.28,-4.22 -8.055,-4.22 -8.055,4.945 -9.98,4.945 -9.98,5.866 ; -12.23,-0.77 -12.23,-1.756 ccw(c-11.43,-0.37) -12.23,1.016 -12.23,0.03 ; -5.329,4.945 -5.329,5.139 ccw(c-5.522,5.139) -5.374,5.263 -5.614,5.548 cw(c-5.467,5.673) -5.467,5.866 -2.154,5.866 cw(c-2.154,5.673) -2.006,5.548 -2.246,5.263 ccw(c-2.098,5.139) -2.292,5.139 -2.292,4.945 ; -5.26,5.866 -5.26,4.945 -7.185,4.945 -7.185,-4.22 -0.435,-4.22 -0.435,4.945 -2.36,4.945 -2.36,5.866 ; 2.294,4.945 2.294,5.139 ccw(c2.101,5.139) 2.248,5.263 2.008,5.548 cw(c2.156,5.673) 2.156,5.866 5.469,5.866 cw(c5.469,5.673) 5.617,5.548 5.377,5.263 ccw(c5.525,5.139) 5.331,5.139 5.331,4.945 ; 2.363,5.866 2.363,4.945 0.438,4.945 0.438,-4.22 7.188,-4.22 7.188,4.945 5.263,4.945 5.263,5.866 ; 9.914,4.945 9.914,5.139 ccw(c9.721,5.139) 9.868,5.263 9.628,5.548 cw(c9.776,5.673) 9.776,5.866 13.089,5.866 cw(c13.089,5.673) 13.237,5.548 12.997,5.263 ccw(c13.145,5.139) 12.951,5.139 12.951,4.945 ; 9.983,5.866 9.983,4.945 8.058,4.945 8.058,-4.22 14.28,-4.22 14.28,4.945 12.883,4.945 12.883,5.866 ; 16.79,-2.37 16.79,1.63 ; -23.29,-6.27 ccw(c-22.79,-6.27) -22.79,-6.77 22.79,-6.77 ccw(c22.79,-6.27) 23.29,-6.27 23.29,5.53 ccw(c22.79,5.53) 22.79,6.03 15.69,6.03 15.69,6.77 -15.69,6.77 -15.69,6.03 -22.79,6.03 ccw(c-22.79,5.53) -23.29,5.53 -23.29,-6.27 ; -19.49,-2.37 cw(c-19.49,-0.37) -19.49,1.63 -16.29,1.63 -16.29,3.157 -15.69,3.157 -15.69,-3.897 -16.29,-3.897 -16.29,-2.37 -19.49,-2.37 ; -12.93,-0.77 -12.93,0.03 -9.93,0.03 -9.93,-0.77 -12.93,-0.77 ; -7.821,0.295 -7.62,-0.455 -7.419,0.295 -7.821,0.295 ; -7.821,6.975 -7.419,6.975 -7.62,6.77 -7.821,6.975 ; -5.31,-0.77 -5.31,0.03 -2.31,0.03 -2.31,-0.77 -5.31,-0.77 ; -0.201,0.295 0,-0.455 0.201,0.295 -0.201,0.295 ; -0.201,6.975 0.201,6.975 0,6.77 -0.201,6.975 ; 2.31,-0.77 2.31,0.03 5.31,0.03 5.31,-0.77 2.31,-0.77 ; 7.419,0.295 7.821,0.295 7.62,-0.455 7.419,0.295 ; 7.419,6.975 7.62,6.77 7.821,6.975 7.419,6.975 ; 9.93,-0.77 9.93,0.03 12.93,0.03 12.93,-0.77 9.93,-0.77 ; 15.69,-3.897 15.69,3.157 16.29,3.157 16.29,1.63 19.49,1.63 cw(c19.49,-0.37) 19.49,-2.37 16.29,-2.37 16.29,-3.897 15.69,-3.897
  text "1" at -16.795,6.6 h1
  text "4" at 9.315,2.975 h1
  text "3" at 1.695,2.975 h1
  text "2" at -5.925,2.975 h1
  text "1" at -13.545,2.975 h1
3D body "PHOENIX_1720929.stp": height 29.25, standoff -5, extent -23.29,-6.77 23.29,7.52